# Altium footprint library pcb.PcbLib: 397 footprints (part 14 of 25)
Each footprint in its own frame and in the unit in brackets; x right, y up, seen from the top. Pads: shape width x height; smd on the part's side, far side on the other; paste and mask are expansions set on the pad; w line width, h text height; cw(c..) or ccw(c..) is an arc to the next point about the centre after c.
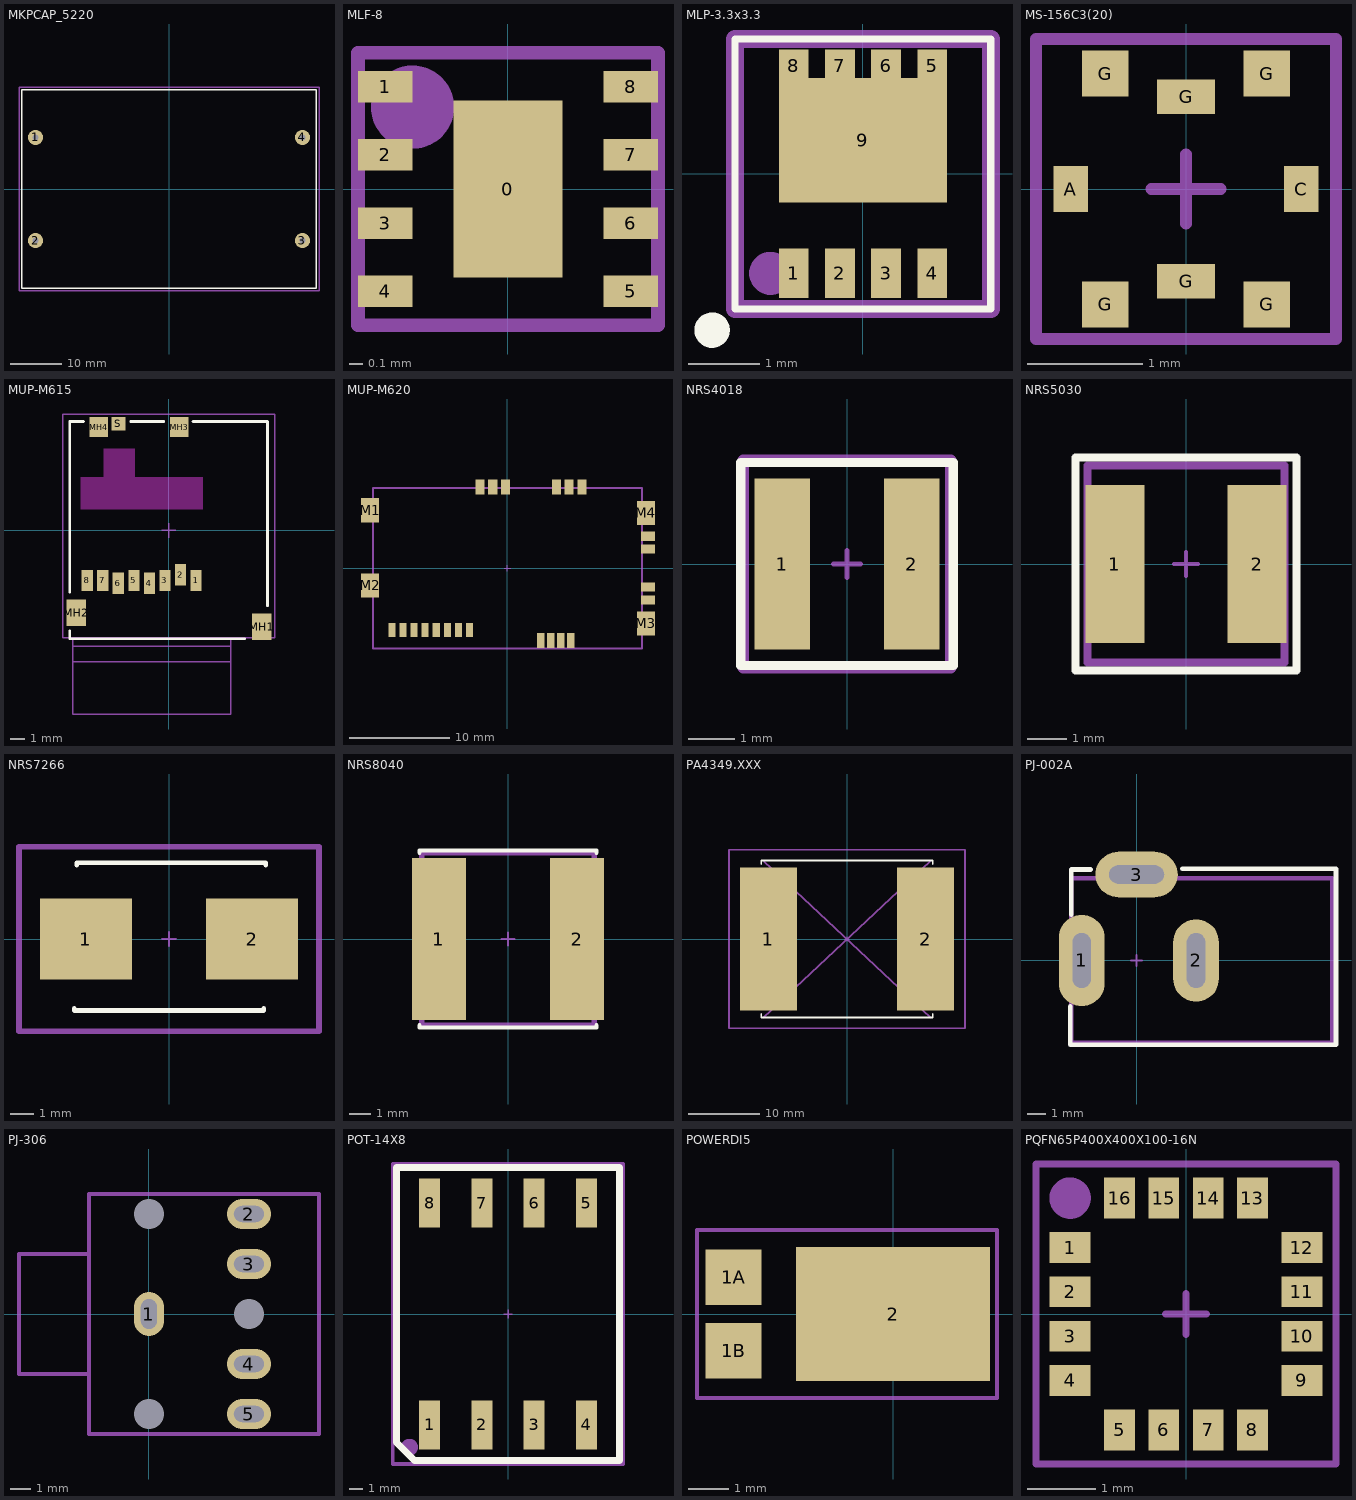
[diagram p13: the footprints below, top view; thin cyan lines are the x and y axes]

## MKPCAP_5220 [mm]
pads (4):
  round 3 hole 1.2: 1(-26.25,10.15) 2(-26.25,-10.15) 3(26.25,-10.15) 4(26.25,10.15)
Top Overlay:
  lines w0.254: -29,-19.5 -29,19.5 29,19.5 29,-19.5 -29,-19.5
Mechanical 15:
  lines w0.254: -29.5,-20 -29.5,20 29.5,20 29.5,-20 -29.5,-20
3D body: height 24, standoff 0, extent -28.8,-19.5 28.8,19.5

## MLF-8 [mm]
height 1
pads (9):
  rect 0.8x1.3 smd paste-50 mask+0.07: 0(0,0)
  rect 0.4x0.23 smd paste-0.02 mask+0.07: 1(-0.9,0.75) 2(-0.9,0.25) 3(-0.9,-0.25) 4(-0.9,-0.75) 5(0.9,-0.75) 6(0.9,-0.25) 7(0.9,0.25) 8(0.9,0.75)
Top Paste:
  rectangle: -0.3,0.1 0.3,0.5
  rectangle: -0.31,-0.5 0.3,-0.1
Mechanical 15:
  circle w0.406: c-0.7,0.6 r0.102
  lines w0.1: -0.3,0 0.3,0 ; 0,-0.3 0,0.3 ; -1.1,-1 1.1,-1 1.1,1 -1.1,1 -1.1,-1
  text ".Designator" at -0.9,-0.8 h0.76
3D body: height 1, standoff 0, extent -1,-1 1,1

## MLP-3.3x3.3 [mm]
height 1
pads (9):
  rect 0.42x0.7 smd paste-0.02 mask+0.07: 1(-0.975,-1.4) 2(-0.325,-1.4) 3(0.325,-1.4) 4(0.975,-1.4)
  rect 0.42x0.45 smd paste-0.02 mask+0.07: 5(0.975,1.525) 6(0.325,1.525) 7(-0.325,1.525) 8(-0.975,1.525)
  rect 2.37x1.75 smd paste-1000 mask+0.07: 9(0,0.473)
Top Overlay:
  circle w0.25: c-2.125,-2.2 r0.125
  lines w0.1: -1.8,-1.9 -1.8,1.9 1.8,1.9 1.8,-1.9 -1.8,-1.9
Top Paste:
  region: -1.051,1.167 -1.051,0.527 -0.051,0.527 -0.051,1.167
  region: 0.051,1.167 0.051,0.527 1.051,0.527 1.051,1.167
  region: -1.067,0.354 -1.067,-0.286 -0.067,-0.286 -0.067,0.354
  region: 0.051,0.354 0.051,-0.286 1.051,-0.286 1.051,0.354
Mechanical 15:
  circle w0.406: c-1.3,-1.4 r0.1
  lines w0.1: -0.3,0 0.3,0 ; 0,-0.3 0,0.3
  lines w0.254: -1.8,-1.9 1.8,-1.9 1.8,1.9 -1.8,1.9 -1.8,-1.9
  text ".Designator" at -1.5,0.6 h1.02
3D body: height 1, standoff 0, extent -1.65,-1.65 1.65,1.65

## MS-156C3(20) [mm]
height 3
pads (8):
  rect 0.3x0.4 smd: A(-1,0) C(1,0)
  rect 0.4x0.4 smd: G(-0.7,-1) G(-0.7,1) G(0.7,-1) G(0.7,1)
  rect 0.5x0.3 smd: G(0,-0.8) G(0,0.8)
Mechanical 15:
  lines w0.1: -0.3,0 0.3,0 ; 0,-0.3 0,0.3 ; -1.3,-1.3 1.3,-1.3 1.3,1.3 -1.3,1.3 -1.3,-1.3
  text ".Designator" at -1.3,-1.3 h1.02
3D body "MS-156C3.stp": height 1.36, standoff 0.01, extent -1.15,-1.15 1.15,1.15

## MUP-M615 [mm] "microSD connector"
height 1.78
pads (13):
  rect 0.8x1.5 smd: 1(1.94,-3.535) 2(0.84,-3.135) 3(-0.26,-3.535) 4(-1.36,-3.735) 5(-2.46,-3.535) 6(-3.56,-3.735) 7(-4.66,-3.535) 8(-5.76,-3.535)
  rect 1.4x1.9 smd: MH1(6.6,-6.825) MH2(-6.55,-5.825)
  rect 1.3x1.4 smd: MH3(0.75,7.325) MH4(-4.95,7.325)
  rect 1x0.95 smd: S(-3.56,7.55)
Top Layer keep-out:
  rectangle: -4.6,3.7 -2.4,5.8
  rectangle: -6.25,1.495 2.45,3.795
Top Overlay:
  lines w0.2: -7,-7.1 -7,-7.675 5.39,-7.675 ; -7,-4.355 -7,7.725 -6.02,7.725 ; -2.69,7.725 -0.35,7.725 ; 1.72,7.725 7,7.725 7,-5.335
Mechanical 15:
  lines w0.1: -6.8,-9.3 4.4,-9.3 ; -6.8,-8.2 4.4,-8.2 ; -6.8,-7.6 -6.8,-13 4.4,-13 4.4,-7.6 ; -0.5,0 0.5,0 ; 0,-0.5 0,0.5 ; -7.5,-7.6 -7.5,8.25 7.5,8.25 7.5,-7.6 -7.5,-7.6
  text "ejected" at -5.9,-13.5 h0.5
  text "locked" at -5.9,-9.9 h0.5
  text "insert/eject" at -5.8,-8.7 h0.5
  text ".Designator" at -6.7,5.2 h1.02
3D body: height 1.45, standoff 0.65, extent -6.8,-9.3 4.4,5.7
3D body: height 1.4, standoff 0.7, extent -6.8,-13 4.4,-9.3
3D body "mem2051-00-195-00-a_revb.step": height 2, standoff 0.05, extent -7.1,-7.625 7.1,7.725

## MUP-M620 [mm]
height 4.35
pads (26):
  rect 0.7x1.4 smd: 1(-3.8,-6.18) 2(-4.9,-6.18) 3(-6,-6.18) 4(-7.1,-6.18) 5(-8.2,-6.18) 6(-9.3,-6.18) 7(-10.4,-6.18) 8(-11.5,-6.18)
  rect 1.4x0.9 smd: L_C1(14,3.175) L_C2(14,1.905) L_C3(14,-1.905) L_C4(14,-3.175)
  rect 0.75x1.5 smd: L_C5(6.3,-7.2) L_C6(5.3,-7.2) L_C7(4.3,-7.2) L_C8(3.3,-7.2)
  rect 1.8x2.4 smd: M1(-13.7,5.77) M2(-13.7,-1.73) M3(13.8,-5.5) M4(13.8,5.5)
  rect 0.9x1.5 smd: U_C1(7.42,8.07) U_C2(6.15,8.07) U_C3(4.88,8.07) U_C5(-0.2,8.07) U_C6(-1.47,8.07) U_C7(-2.74,8.07)
Mechanical 15:
  lines w0.1: -0.3,0 0.3,0 ; 0,-0.3 0,0.3
  lines w0.2: -13.4,-8 -13.4,8 13.4,8 13.4,-8 -13.4,-8
  text "insert" at -4.8,-9.5 h1.02
  text ".Designator" at -11.5,-3.7 h1.02
3D body: height 4.16, standoff 3.3, extent -12.5,-8.4 12.5,6.6
3D body: height 2.56, standoff 1.8, extent -12.5,-8.4 12.5,6.6
3D body: height 1.5, standoff 0.5, extent -12.5,-8.4 -1.5,6.6
3D body "M620.stp": height 4.4, standoff -0.05, extent -14.25,-8.1 14.45,8.7

## NRS4018 [mm]
height 1.8
pads (2):
  rect 1.2x3.7 smd: 1(-1.4,0) 2(1.4,0)
Top Overlay:
  lines w0.2: -2.3,-2.2 2.3,-2.2 2.3,2.2 -2.3,2.2 -2.3,-2.2
Mechanical 15:
  lines w0.1: -0.3,0 0.3,0 ; 0,-0.3 0,0.3
  lines w0.254: -2.25,-2.25 2.25,-2.25 2.25,2.25 -2.25,2.25 -2.25,-2.25
  text ".Designator" at -1.575,-1.524 h1.02
3D body: height 1.8, standoff 0, extent -2,-2 2,2

## NRS5030 [mm]
height 3
pads (2):
  rect 1.5x4 smd: 1(-1.8,0) 2(1.8,0)
Top Overlay:
  lines w0.2: -2.8,-2.7 -2.8,2.7 2.8,2.7 2.8,-2.7 -2.8,-2.7
Mechanical 15:
  lines w0.1: -0.3,0 0.3,0 ; 0,-0.3 0,0.3
  lines w0.2: -2.5,-2.5 -2.5,2.5 2.5,2.5 2.5,-2.5 -2.5,-2.5
  text ".Designator" at -1.575,-1.524 h1.02
3D body: height 1.8, standoff 0, extent -2.5,-2.5 2.5,2.5

## NRS7266 [mm]
height 4
pads (2):
  rect 4x3.5 smd: 1(-3.6,0) 2(3.6,0)
Top Overlay:
  lines w0.2: -4.1,-3 -4.1,-3.1 4.1,-3.1 4.1,-3 ; -4,3.2 -4,3.3 4.2,3.3 4.2,3.2
Mechanical 15:
  lines w0.1: -0.3,0 0.3,0 ; 0,-0.3 0,0.3
  lines w0.254: -6.5,-4 -6.5,4 6.5,4 6.5,-4 -6.5,-4
  text ".Designator" at -1.575,-1.524 h1.02
3D body: height 4, standoff 0, extent -3.6,-3.2 3.6,3.2

## NRS8040 [mm]
height 4
pads (2):
  rect 2.5x7.5 smd: 1(-3.2,0) 2(3.2,0)
Top Overlay:
  lines w0.2: -4.1,-4 -4.1,-4.1 4.1,-4.1 4.1,-4 ; -4.1,4 -4.1,4.1 4.1,4.1 4.1,4
Mechanical 15:
  lines w0.1: -0.3,0 0.3,0 ; 0,-0.3 0,0.3
  lines w0.254: -4,-4 -4,4 4,4 4,-4 -4,-4
  text ".Designator" at -1.575,-1.524 h1.02
3D body: height 4, standoff 0, extent -4,-4 4,4

## PA4349.XXX [mm] "Fixed soft sat Pulse inductor PA4349 series"
height 12.6
pads (2):
  rect 8x20 smd: 1(-11,0) 2(11,0)
Top Overlay:
  lines w0.254: -12,-10.5 -12,-11 12,-11 12,-10.5 ; -12,10.5 -12,11 12,11 12,10.5
Mechanical 15:
  lines w0.1: -0.3,0 0.3,0 ; 0,-0.3 0,0.3
  lines w0.2: -11.75,-11 11.625,10.875 ; -11.625,10.875 11.75,-11
  lines w0.254: -16.5,-12.5 -16.5,12.5 16.5,12.5 16.5,11.5 16.5,-12.5 4,-12.5 -16.5,-12.5
  text ".Designator" at -15,-12.1 h1.02
3D body: height 13, standoff 0, extent -11.75,-11 11.75,11

## PJ-002A [mm]
height 11
pads (3):
  oval 2.5x5 hole 1 slot 3 at 90 deg: 1(-3,0)
  oval 2.5x4.5 hole 1 slot 3 at 90 deg: 2(3.25,0)
  oval 4.5x2.5 hole 1 slot 3 at 0 deg: 3(0,4.7)
Top Overlay:
  lines w0.254: -3.625,-2.5 -3.625,-4.6 10.9,-4.6 10.9,5.025 2.5,5.025 ; -3.575,2.5 -3.575,4.975 -2.5,4.975
Mechanical 15:
  lines w0.1: -0.3,0 0.3,0 ; 0,-0.3 0,0.3
  lines w0.254: -3.575,-4.5 -3.575,4.5 10.7,4.5 10.7,-4.5 -3.575,-4.5
  text ".Designator" at -2.4,-3.6 h1.02
3D body "54-00167.STEP": height 10.89, standoff -3.71, extent -3.45,-4.5 10.85,5

## PJ-306 [mm]
height 9.5
pads (8):
  oval 1.5x2.2 hole 0.8 slot 1.5 at 90 deg: 1(0,0)
  oval 2.2x1.5 hole 0.8 slot 1.5 at 0 deg: 2(5,5) 3(5,2.5) 4(5,-2.5) 5(5,-5)
  round 0 hole 1.5 unplated: ""(0,-5) ""(0,5) ""(5,0)
Mechanical 15:
  lines w0.1: -0.3,0 0.3,0 ; 0,-0.3 0,0.3
  lines w0.2: -3,-3 -6.5,-3 -6.5,3 -3,3 ; -3,-6 8.5,-6 8.5,6 -3,6 -3,-6
  text ".Designator" at -2,-5 h1.02
3D body "SJ1-3545N.stp": height 9.5, standoff -5.5, extent -6.5,-6.1 8.5,6.1

## POT-14X8 [mm]
height 10
pads (8):
  rect 1.5x3.5 smd: 1(-5.625,-7.95) 2(-1.875,-7.95) 3(1.875,-7.95) 4(5.625,-7.95) 5(5.625,7.95) 6(1.875,7.95) 7(-1.875,7.95) 8(-5.625,7.95)
Top Overlay:
  lines w0.5: -8,-9.2 -6.7,-10.5 8,-10.5 8,10.5 -8,10.5 -8,-9.2
Mechanical 15:
  circle w1: c-7.06,-9.55 r0.1
  lines w0.1: -0.3,0 0.3,0 ; 0,-0.3 0,0.3
  lines w0.254: -8.25,-10.75 8.25,-10.75 8.25,10.75 -8.25,10.75 -8.25,-10.75
  text ".Designator" at -4.5,1.5 h1.02
3D body: height 10, standoff 0, extent -7.5,-8 7.5,8

## POWERDI5 [mm] "POWERDI5"
height 1.15
pads (3):
  rect 1.4x1.39 smd: 1A(-3.982,0.92) 1B(-3.982,-0.92)
  rect 4.86x3.36 smd: 2(0,0)
Mechanical 15:
  lines w0.1: -0.2,0 0.2,0 ; 0,-0.2 0,0.2 ; -4.9,-2.1 2.6,-2.1 2.6,2.1 -4.9,2.1 -4.9,-2.1
  text "K" at 1.5,0.5 h1.02
  text "A" at -4.3,0.6 h1.02
  text ".Designator" at -4.6,-1.6 h1.02
3D body: height 1.15, standoff 0, extent -4.4,-2 2.2,2

## PQFN65P400X400X100-16N [mm]
pads (16):
  rect 0.6x0.45 smd paste-0.05 mask+0.07: 1(-1.7,0.975) 2(-1.7,0.325) 3(-1.7,-0.325) 4(-1.7,-0.975) 9(1.7,-0.975) 10(1.7,-0.325) 11(1.7,0.325) 12(1.7,0.975)
  rect 0.45x0.6 smd paste-0.05 mask+0.07: 5(-0.975,-1.7) 6(-0.325,-1.7) 7(0.325,-1.7) 8(0.975,-1.7) 13(0.975,1.7) 14(0.325,1.7) 15(-0.325,1.7) 16(-0.975,1.7)
Mechanical 15:
  circle w0.406: c-1.7,1.7 r0.1
  lines w0.1: -0.3,0 0.3,0 ; 0,-0.3 0,0.3 ; -2.2,-2.2 -2.2,2.2 2.2,2.2 2.2,-2.2 -2.2,-2.2
  text ".Designator" at -1.6,-1.6 h1.02
3D body: height 0.8, standoff 0, extent -2,-2 2,2